# Altium footprint library STM32F0.PcbLib: 228 footprints (part 7 of 16)
Each footprint in its own frame and in the unit in brackets; x right, y up, seen from the top. Pads: shape width x height; smd on the part's side, far side on the other; paste and mask are expansions set on the pad; w line width, h text height; cw(c..) or ccw(c..) is an arc to the next point about the centre after c.
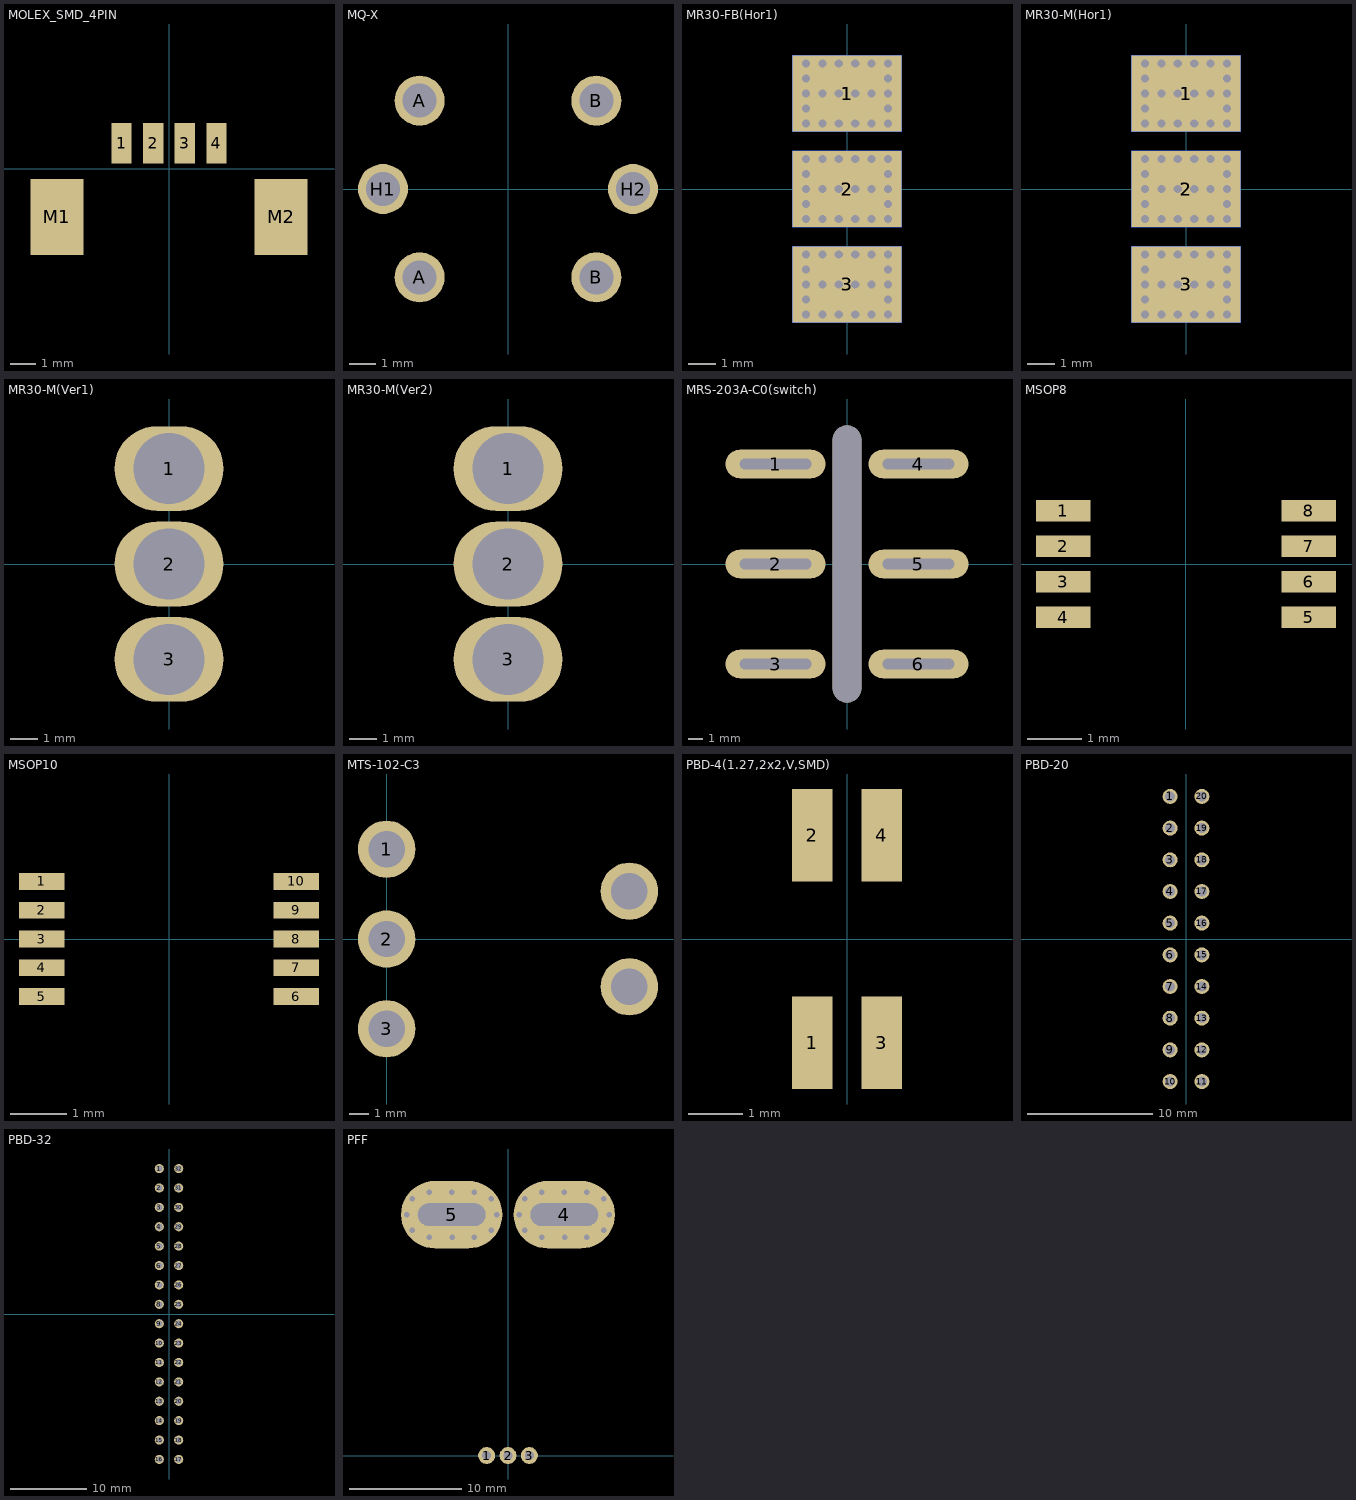
[diagram p6: the footprints below, top view; thin cyan lines are the x and y axes]

## MOLEX_SMD_4PIN [mm]
pads (6):
  rect 0.8x1.6 smd: 1(-1.875,1) 2(-0.625,1) 3(0.625,1) 4(1.875,1)
  rect 2.1x3 smd: M1(-4.425,-1.9) M2(4.425,-1.9)
3D body "53261-0471.stp": height 3.4, standoff 0, extent -5.075,-3.675 5.075,1.525

## MQ-X [mm]
pads (6):
  round 1.9 hole 1.3: A(-3.359,3.359) A(-3.359,-3.359) B(3.359,3.359) B(3.359,-3.359) H1(-4.75,0) H2(4.75,0)
3D body "User Library-MQ135.step": height 14, standoff -7.5, extent -9.75,-9.75 9.75,9.75

## MR30-FB(Hor1) [mm]
pads (6):
  rect 4x2.8 smd: 1(0,3.5) 2(0,0) 3(0,-3.5)
  rect 4x2.8 smd far side: 1(0,3.5) 2(0,0) 3(0,-3.5)
via -0.9,1.1 diameter 0.6 hole 0.3
via -0.3,1.1 diameter 0.6 hole 0.3
via 0.3,1.1 diameter 0.6 hole 0.3
via 0.9,1.1 diameter 0.6 hole 0.3
via 1.5,1.1 diameter 0.6 hole 0.3
via -1.5,0 diameter 0.6 hole 0.3
via -0.9,0 diameter 0.6 hole 0.3
via -0.3,0 diameter 0.6 hole 0.3
via 0.3,0 diameter 0.6 hole 0.3
via 0.9,0 diameter 0.6 hole 0.3
via 1.5,0 diameter 0.6 hole 0.3
via -1.5,-1.1 diameter 0.6 hole 0.3
via -0.9,-1.1 diameter 0.6 hole 0.3
via -0.3,-1.1 diameter 0.6 hole 0.3
via 0.3,-1.1 diameter 0.6 hole 0.3
via 0.9,-1.1 diameter 0.6 hole 0.3
via 1.5,-1.1 diameter 0.6 hole 0.3
via -1.5,1.1 diameter 0.6 hole 0.3
via -1.5,0.55 diameter 0.6 hole 0.3
via -1.5,-0.55 diameter 0.6 hole 0.3
via 1.5,0.55 diameter 0.6 hole 0.3
via 1.5,-0.55 diameter 0.6 hole 0.3
via -0.9,-2.4 diameter 0.6 hole 0.3
via -0.3,-2.4 diameter 0.6 hole 0.3
via 0.3,-2.4 diameter 0.6 hole 0.3
via 0.9,-2.4 diameter 0.6 hole 0.3
via 1.5,-2.4 diameter 0.6 hole 0.3
via -1.5,-3.5 diameter 0.6 hole 0.3
via -0.9,-3.5 diameter 0.6 hole 0.3
via -0.3,-3.5 diameter 0.6 hole 0.3
via 0.3,-3.5 diameter 0.6 hole 0.3
via 0.9,-3.5 diameter 0.6 hole 0.3
via 1.5,-3.5 diameter 0.6 hole 0.3
via -1.5,-4.6 diameter 0.6 hole 0.3
via -0.9,-4.6 diameter 0.6 hole 0.3
via -0.3,-4.6 diameter 0.6 hole 0.3
via 0.3,-4.6 diameter 0.6 hole 0.3
via 0.9,-4.6 diameter 0.6 hole 0.3
via 1.5,-4.6 diameter 0.6 hole 0.3
via -1.5,-2.4 diameter 0.6 hole 0.3
via -1.5,-2.95 diameter 0.6 hole 0.3
via -1.5,-4.05 diameter 0.6 hole 0.3
via 1.5,-2.95 diameter 0.6 hole 0.3
via 1.5,-4.05 diameter 0.6 hole 0.3
via -0.9,4.6 diameter 0.6 hole 0.3
via -0.3,4.6 diameter 0.6 hole 0.3
via 0.3,4.6 diameter 0.6 hole 0.3
via 0.9,4.6 diameter 0.6 hole 0.3
via 1.5,4.6 diameter 0.6 hole 0.3
via -1.5,3.5 diameter 0.6 hole 0.3
via -0.9,3.5 diameter 0.6 hole 0.3
via -0.3,3.5 diameter 0.6 hole 0.3
via 0.3,3.5 diameter 0.6 hole 0.3
via 0.9,3.5 diameter 0.6 hole 0.3
via 1.5,3.5 diameter 0.6 hole 0.3
via -1.5,2.4 diameter 0.6 hole 0.3
via -0.9,2.4 diameter 0.6 hole 0.3
via -0.3,2.4 diameter 0.6 hole 0.3
via 0.3,2.4 diameter 0.6 hole 0.3
via 0.9,2.4 diameter 0.6 hole 0.3
via 1.5,2.4 diameter 0.6 hole 0.3
via -1.5,4.6 diameter 0.6 hole 0.3
via -1.5,4.05 diameter 0.6 hole 0.3
via -1.5,2.95 diameter 0.6 hole 0.3
via 1.5,4.05 diameter 0.6 hole 0.3
via 1.5,2.95 diameter 0.6 hole 0.3
3D body "MR30-FB.STEP": height 2.6, standoff -2.6, extent -0.3,-6.1 12.2,6.1

## MR30-M(Hor1) [mm]
pads (6):
  rect 4x2.8 smd: 1(0,3.5) 2(0,0) 3(0,-3.5)
  rect 4x2.8 smd far side: 1(0,3.5) 2(0,0) 3(0,-3.5)
via -0.9,1.1 diameter 0.6 hole 0.3
via -0.3,1.1 diameter 0.6 hole 0.3
via 0.3,1.1 diameter 0.6 hole 0.3
via 0.9,1.1 diameter 0.6 hole 0.3
via 1.5,1.1 diameter 0.6 hole 0.3
via -1.5,0 diameter 0.6 hole 0.3
via -0.9,0 diameter 0.6 hole 0.3
via -0.3,0 diameter 0.6 hole 0.3
via 0.3,0 diameter 0.6 hole 0.3
via 0.9,0 diameter 0.6 hole 0.3
via 1.5,0 diameter 0.6 hole 0.3
via -1.5,-1.1 diameter 0.6 hole 0.3
via -0.9,-1.1 diameter 0.6 hole 0.3
via -0.3,-1.1 diameter 0.6 hole 0.3
via 0.3,-1.1 diameter 0.6 hole 0.3
via 0.9,-1.1 diameter 0.6 hole 0.3
via 1.5,-1.1 diameter 0.6 hole 0.3
via -1.5,1.1 diameter 0.6 hole 0.3
via -1.5,0.55 diameter 0.6 hole 0.3
via -1.5,-0.55 diameter 0.6 hole 0.3
via 1.5,0.55 diameter 0.6 hole 0.3
via 1.5,-0.55 diameter 0.6 hole 0.3
via -0.9,-2.4 diameter 0.6 hole 0.3
via -0.3,-2.4 diameter 0.6 hole 0.3
via 0.3,-2.4 diameter 0.6 hole 0.3
via 0.9,-2.4 diameter 0.6 hole 0.3
via 1.5,-2.4 diameter 0.6 hole 0.3
via -1.5,-3.5 diameter 0.6 hole 0.3
via -0.9,-3.5 diameter 0.6 hole 0.3
via -0.3,-3.5 diameter 0.6 hole 0.3
via 0.3,-3.5 diameter 0.6 hole 0.3
via 0.9,-3.5 diameter 0.6 hole 0.3
via 1.5,-3.5 diameter 0.6 hole 0.3
via -1.5,-4.6 diameter 0.6 hole 0.3
via -0.9,-4.6 diameter 0.6 hole 0.3
via -0.3,-4.6 diameter 0.6 hole 0.3
via 0.3,-4.6 diameter 0.6 hole 0.3
via 0.9,-4.6 diameter 0.6 hole 0.3
via 1.5,-4.6 diameter 0.6 hole 0.3
via -1.5,-2.4 diameter 0.6 hole 0.3
via -1.5,-2.95 diameter 0.6 hole 0.3
via -1.5,-4.05 diameter 0.6 hole 0.3
via 1.5,-2.95 diameter 0.6 hole 0.3
via 1.5,-4.05 diameter 0.6 hole 0.3
via -0.9,4.6 diameter 0.6 hole 0.3
via -0.3,4.6 diameter 0.6 hole 0.3
via 0.3,4.6 diameter 0.6 hole 0.3
via 0.9,4.6 diameter 0.6 hole 0.3
via 1.5,4.6 diameter 0.6 hole 0.3
via -1.5,3.5 diameter 0.6 hole 0.3
via -0.9,3.5 diameter 0.6 hole 0.3
via -0.3,3.5 diameter 0.6 hole 0.3
via 0.3,3.5 diameter 0.6 hole 0.3
via 0.9,3.5 diameter 0.6 hole 0.3
via 1.5,3.5 diameter 0.6 hole 0.3
via -1.5,2.4 diameter 0.6 hole 0.3
via -0.9,2.4 diameter 0.6 hole 0.3
via -0.3,2.4 diameter 0.6 hole 0.3
via 0.3,2.4 diameter 0.6 hole 0.3
via 0.9,2.4 diameter 0.6 hole 0.3
via 1.5,2.4 diameter 0.6 hole 0.3
via -1.5,4.6 diameter 0.6 hole 0.3
via -1.5,4.05 diameter 0.6 hole 0.3
via -1.5,2.95 diameter 0.6 hole 0.3
via 1.5,4.05 diameter 0.6 hole 0.3
via 1.5,2.95 diameter 0.6 hole 0.3
3D body "MR30-M.STEP": height 2.55, standoff -2.55, extent -0.2,-6.05 13.3,6.05

## MR30-M(Ver1) [mm]
pads (3):
  oval 4x3.1 hole 2.6: 1(0,3.5) 2(0,0) 3(0,-3.5)
3D body "MR30-M.STEP": height 10.5, standoff -3, extent -2.55,-6.05 2.55,6.05

## MR30-M(Ver2) [mm]
pads (3):
  oval 4x3.1 hole 2.6: 1(0,3.5) 2(0,0) 3(0,-3.5)
3D body "MR30-M.step": height 7.19, standoff -6, extent -1.25,2.25 1.25,4.749
3D body "MR30-M.step": height 7.19, standoff -6, extent -1.25,-4.75 1.25,-2.251
3D body "MR30-M.step": height 7.19, standoff -6, extent -1.25,-1.25 1.25,1.249

## MRS-203A-C0(switch) [mm]
pads (7):
  oval 7x2 hole 0.762 slot 5 at 0 deg: 1(-5,7) 2(-5,0) 3(-5,-7) 4(5,7) 5(5,0) 6(5,-7)
  oval 2x19.4 hole 2 slot 19.4 at 90 deg unplated: ""(0,0)

## MSOP8 [mm]
pads (8):
  rect 1x0.4 smd: 1(-2.25,0.975) 2(-2.25,0.325) 3(-2.25,-0.325) 4(-2.25,-0.975) 5(2.25,-0.975) 6(2.25,-0.325) 7(2.25,0.325) 8(2.25,0.975)
3D body "User Library-MSOP8.step": height 1.1, standoff 0, extent -2.469,-1.55 2.469,1.55

## MSOP10 [mm]
pads (10):
  rect 0.8x0.3 smd: 1(-2.25,1.016) 2(-2.25,0.508) 3(-2.25,0) 4(-2.25,-0.508) 5(-2.25,-1.016) 6(2.25,-1.016) 7(2.25,-0.508) 8(2.25,0) 9(2.25,0.508) 10(2.25,1.016)
3D body "User Library-MSOP-10-1.step": height 1.05, standoff 0, extent -2.514,-1.5 2.514,1.5

## MTS-102-C3 [mm]
pads (5):
  round 3 hole 1.9: 1(0,4.7) 2(0,0) 3(0,-4.7) ""(12.7,-2.5) ""(12.7,2.5)
3D body "User Library-MTS-102-C3.step": height 8.46, standoff -2.64, extent -0.725,-6.533 26.524,6.667

## PBD-4(1.27,2x2,V,SMD) [mm]
pads (4):
  rect 0.74x1.7 smd: 1(-0.635,-1.9) 2(-0.635,1.9) 3(0.635,-1.9) 4(0.635,1.9)
3D body "User Library-PBD1_27-xx-S.step": height 4.5, standoff 0, extent -1.27,-2.5 1.27,2.5

## PBD-20 [mm]
pads (20):
  round 1.2 hole 0.8: 1(-1.27,11.43) 2(-1.27,8.89) 3(-1.27,6.35) 4(-1.27,3.81) 5(-1.27,1.27) 6(-1.27,-1.27) 7(-1.27,-3.81) 8(-1.27,-6.35) 9(-1.27,-8.89) 10(-1.27,-11.43) 11(1.27,-11.43) 12(1.27,-8.89) 13(1.27,-6.35) 14(1.27,-3.81) 15(1.27,-1.27) 16(1.27,1.27) 17(1.27,3.81) 18(1.27,6.35) 19(1.27,8.89) 20(1.27,11.43)
3D body "User Library-PBD-R.step": height 5, standoff -3, extent -1.57,-12.7 11.43,12.7

## PBD-32 [mm]
pads (32):
  round 1.2 hole 0.8: 1(-1.27,19.05) 2(-1.27,16.51) 3(-1.27,13.97) 4(-1.27,11.43) 5(-1.27,8.89) 6(-1.27,6.35) 7(-1.27,3.81) 8(-1.27,1.27) 9(-1.27,-1.27) 10(-1.27,-3.81) 11(-1.27,-6.35) 12(-1.27,-8.89) 13(-1.27,-11.43) 14(-1.27,-13.97) 15(-1.27,-16.51) 16(-1.27,-19.05) 17(1.27,-19.05) 18(1.27,-16.51) 19(1.27,-13.97) 20(1.27,-11.43) 21(1.27,-8.89) 22(1.27,-6.35) 23(1.27,-3.81) 24(1.27,-1.27) 25(1.27,1.27) 26(1.27,3.81) 27(1.27,6.35) 28(1.27,8.89) 29(1.27,11.43) 30(1.27,13.97) 31(1.27,16.51) 32(1.27,19.05)
3D body "User Library-PBD-R (1).step": height 5, standoff -3, extent -1.57,-20.32 11.43,20.32

## PCBComponent_1 [mm]

## PCBComponent_1 - duplicate [mm]

## PFF [mm]
pads (29):
  round 1.5 hole 0.8: 1(-1.9,0) 2(0,0) 3(1.9,0)
  round 0.6 hole 0.5: 4(1,21.4) 4(1.5,20) 4(1.5,22.8) 4(3,19.4) 4(3,23.4) 4(5,23.4) 4(5.05,19.4) 4(7,19.4) 4(7,23.4) 4(8.5,20) 4(8.5,22.8) 4(9,21.4) 5(-9,21.4) 5(-8.5,20) 5(-8.5,22.8) 5(-7,19.4) 5(-7,23.4) 5(-5,23.4) 5(-4.95,19.4) 5(-3,19.4) 5(-3,23.4) 5(-1.5,20) 5(-1.5,22.8) 5(-1,21.4)
  oval 9x6 hole 2 slot 6 at 0 deg: 4(5,21.4) 5(-5,21.4)
3D body "User Library-ACS758.step": height 7.1, standoff -3.52, extent -7,-0.55 7,22.204